# Altium footprint library DIOT_temperature_logger.PcbLib: 100 footprints (part 4 of 7)
Each footprint in its own frame and in the unit in brackets; x right, y up, seen from the top. Pads: shape width x height; smd on the part's side, far side on the other; paste and mask are expansions set on the pad; w line width, h text height; cw(c..) or ccw(c..) is an arc to the next point about the centre after c.
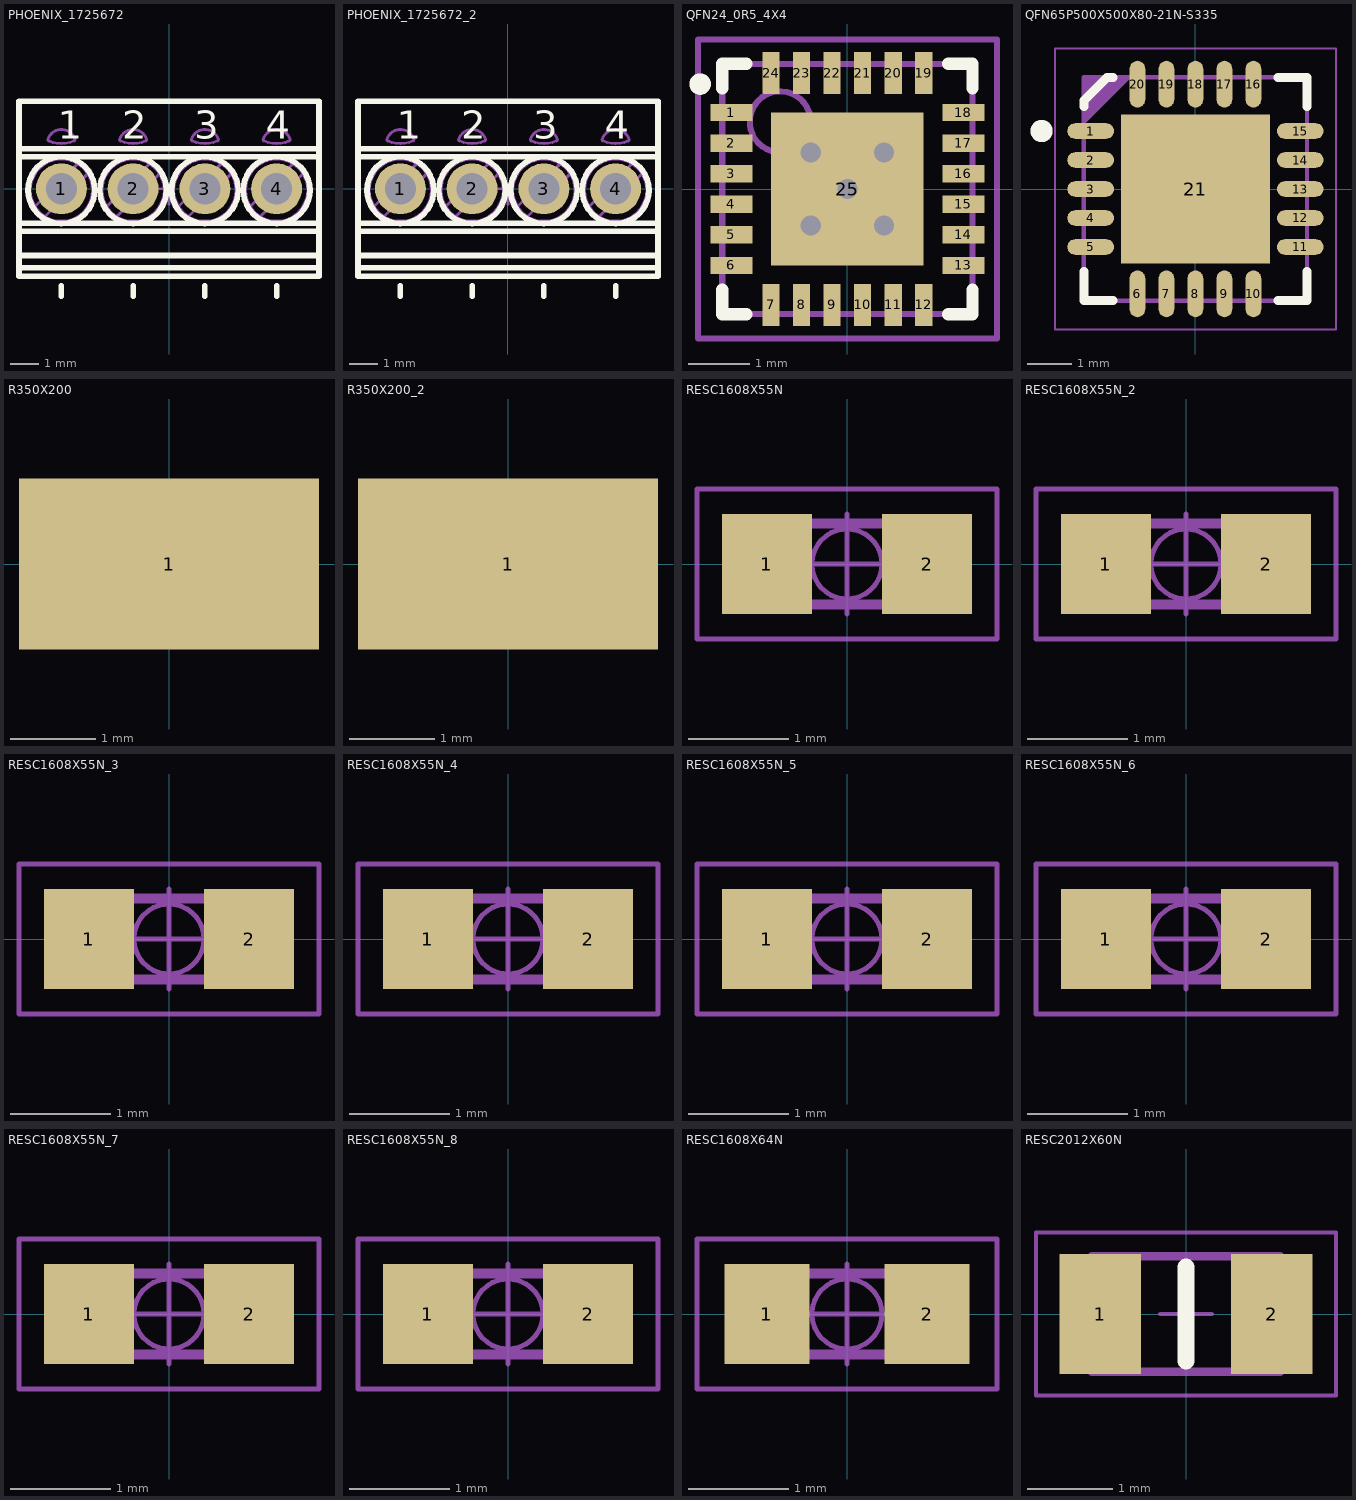
[diagram p3: the footprints below, top view; thin cyan lines are the x and y axes]

## PHOENIX_1725672 [mm]
pads (4):
  round 1.8 hole 1.1: 1(-3.81,0) 2(-1.27,0) 3(1.27,0) 4(3.81,0)
Top Overlay:
  circle w0.2: c3.81,-0.05 r1.18
  circle w0.2: c1.27,-0.05 r1.18
  circle w0.2: c-1.27,-0.05 r1.18
  circle w0.2: c-3.81,-0.05 r1.18
  lines w0.2: -5.31,-2.8 5.31,-2.8 ; -5.31,-2.361 5.31,-2.361 ; -5.31,-1.51 5.31,-1.51 ; -5.31,-1.22 5.31,-1.22 ; -5.31,1.132 5.31,1.132 ; -5.31,1.417 5.31,1.417 ; -3.81,-3.81 -3.81,-3.429 ; -1.27,-3.81 -1.27,-3.429 ; 1.27,-3.81 1.27,-3.429 ; 3.81,-3.81 3.81,-3.429 ; -5.31,-3.1 -5.31,3.1 5.31,3.1 5.31,-3.1 -5.31,-3.1
  text "4" at 3.429,1.778 h1
  text "1" at -3.937,1.778 h1
  text "2" at -1.651,1.778 h1
  text "3" at 0.889,1.778 h1
Mechanical 8:
  lines w0.1: -4.36,0 -3.81,0 -3.81,-0.55 ; -1.82,0 -1.27,0 -1.27,-0.55 ; -0.55,0 0,0 0,-0.55 ; 0.72,0 1.27,0 1.27,-0.55 ; 3.26,0 3.81,0 3.81,-0.55
Mechanical 14:
  circle w0.1: c3.81,-0.05 r1.1
  circle w0.1: c1.27,-0.05 r1.1
  circle w0.1: c-1.27,-0.05 r1.1
  circle w0.1: c-3.81,-0.05 r1.1
  lines w0.1: -5.31,-2.8 5.31,-2.8 ; -5.31,-2.361 5.31,-2.361 ; -5.31,-1.51 5.31,-1.51 ; -5.31,-1.22 5.31,-1.22 ; -5.31,1.132 5.31,1.132 ; -5.31,1.417 5.31,1.417 ; -4.744,-0.631 -3.229,0.884 ; -4.391,-0.984 -2.876,0.531 ; -2.204,-0.631 -0.689,0.884 ; -1.851,-0.984 -0.336,0.531 ; 0.336,-0.631 1.851,0.884 ; 0.689,-0.984 2.204,0.531 ; 2.876,-0.631 4.391,0.884 ; 3.229,-0.984 4.744,0.531 ; -5.31,-3.1 -5.31,3.1 5.31,3.1 5.31,-3.1 -5.31,-3.1 ; -4.285,1.757 cw(c-3.81,1.6) -3.335,1.757 cw(c-3.383,1.741) -3.362,1.696 cw(c-3.81,2.697) -4.258,1.696 cw(c-4.237,1.741) -4.285,1.757 ; -1.745,1.757 cw(c-1.27,1.6) -0.795,1.757 cw(c-0.843,1.741) -0.822,1.696 cw(c-1.27,2.697) -1.718,1.696 cw(c-1.697,1.741) -1.745,1.757 ; 0.795,1.757 cw(c1.27,1.6) 1.745,1.757 cw(c1.697,1.741) 1.718,1.696 cw(c1.27,2.697) 0.822,1.696 cw(c0.843,1.741) 0.795,1.757 ; 3.335,1.757 cw(c3.81,1.6) 4.285,1.757 cw(c4.237,1.741) 4.258,1.696 cw(c3.81,2.697) 3.362,1.696 cw(c3.383,1.741) 3.335,1.757
3D body "PHOENIX_1725672.stp": height 8.5, standoff -3.5, extent -5.31,-3.1 5.31,3.1

## PHOENIX_1725672_2 [mm]
pads (4):
  round 1.8 hole 1.1: 1(-3.81,0) 2(-1.27,0) 3(1.27,0) 4(3.81,0)
Top Overlay:
  circle w0.2: c3.81,-0.05 r1.18
  circle w0.2: c1.27,-0.05 r1.18
  circle w0.2: c-1.27,-0.05 r1.18
  circle w0.2: c-3.81,-0.05 r1.18
  lines w0.2: -5.31,-2.8 5.31,-2.8 ; -5.31,-2.361 5.31,-2.361 ; -5.31,-1.51 5.31,-1.51 ; -5.31,-1.22 5.31,-1.22 ; -5.31,1.132 5.31,1.132 ; -5.31,1.417 5.31,1.417 ; -3.81,-3.81 -3.81,-3.429 ; -1.27,-3.81 -1.27,-3.429 ; 1.27,-3.81 1.27,-3.429 ; 3.81,-3.81 3.81,-3.429 ; -5.31,-3.1 -5.31,3.1 5.31,3.1 5.31,-3.1 -5.31,-3.1
  text "4" at 3.429,1.778 h1
  text "1" at -3.937,1.778 h1
  text "2" at -1.651,1.778 h1
  text "3" at 0.889,1.778 h1
Mechanical 8:
  lines w0.1: -4.36,0 -3.81,0 -3.81,-0.55 ; -1.82,0 -1.27,0 -1.27,-0.55 ; -0.55,0 0,0 0,-0.55 ; 0.72,0 1.27,0 1.27,-0.55 ; 3.26,0 3.81,0 3.81,-0.55
Mechanical 14:
  circle w0.1: c3.81,-0.05 r1.1
  circle w0.1: c1.27,-0.05 r1.1
  circle w0.1: c-1.27,-0.05 r1.1
  circle w0.1: c-3.81,-0.05 r1.1
  lines w0.1: -5.31,-2.8 5.31,-2.8 ; -5.31,-2.361 5.31,-2.361 ; -5.31,-1.51 5.31,-1.51 ; -5.31,-1.22 5.31,-1.22 ; -5.31,1.132 5.31,1.132 ; -5.31,1.417 5.31,1.417 ; -4.744,-0.631 -3.229,0.884 ; -4.391,-0.984 -2.876,0.531 ; -2.204,-0.631 -0.689,0.884 ; -1.851,-0.984 -0.336,0.531 ; 0.336,-0.631 1.851,0.884 ; 0.689,-0.984 2.204,0.531 ; 2.876,-0.631 4.391,0.884 ; 3.229,-0.984 4.744,0.531 ; -5.31,-3.1 -5.31,3.1 5.31,3.1 5.31,-3.1 -5.31,-3.1 ; -4.285,1.757 cw(c-3.81,1.6) -3.335,1.757 cw(c-3.383,1.741) -3.362,1.696 cw(c-3.81,2.697) -4.258,1.696 cw(c-4.237,1.741) -4.285,1.757 ; -1.745,1.757 cw(c-1.27,1.6) -0.795,1.757 cw(c-0.843,1.741) -0.822,1.696 cw(c-1.27,2.697) -1.718,1.696 cw(c-1.697,1.741) -1.745,1.757 ; 0.795,1.757 cw(c1.27,1.6) 1.745,1.757 cw(c1.697,1.741) 1.718,1.696 cw(c1.27,2.697) 0.822,1.696 cw(c0.843,1.741) 0.795,1.757 ; 3.335,1.757 cw(c3.81,1.6) 4.285,1.757 cw(c4.237,1.741) 4.258,1.696 cw(c3.81,2.697) 3.362,1.696 cw(c3.383,1.741) 3.335,1.757
3D body "PHOENIX_1725672.stp": height 8.5, standoff -3.5, extent -5.31,-3.1 5.31,3.1

## QFN24_0R5_4X4 [mm]
pads (25):
  rect 0.69x0.28 smd: 1(-1.9,1.25) 2(-1.9,0.75) 3(-1.9,0.25) 4(-1.9,-0.25) 5(-1.9,-0.75) 6(-1.9,-1.25) 13(1.9,-1.25) 14(1.9,-0.75) 15(1.9,-0.25) 16(1.9,0.25) 17(1.9,0.75) 18(1.9,1.25)
  rect 0.28x0.69 smd: 7(-1.25,-1.9) 8(-0.75,-1.9) 9(-0.25,-1.9) 10(0.25,-1.9) 11(0.75,-1.9) 12(1.25,-1.9) 19(1.25,1.9) 20(0.75,1.9) 21(0.25,1.9) 22(-0.25,1.9) 23(-0.75,1.9) 24(-1.25,1.9)
  rect 2.5x2.5 smd: 25(0,0)
via 0,0 diameter 0.66 hole 0.33
via 0.6,-0.6 diameter 0.66 hole 0.33
via -0.6,-0.6 diameter 0.66 hole 0.33
via 0.6,0.6 diameter 0.66 hole 0.33
via -0.6,0.6 diameter 0.66 hole 0.33
Top Overlay:
  circle w0.25: c-2.413,1.719 r0.051
  lines w0.2: -2.05,-1.651 -2.05,-2.05 -1.651,-2.05 ; -2.05,1.651 -2.05,2.05 -1.651,2.05 ; 1.651,-2.05 2.05,-2.05 2.05,-1.651 ; 1.651,2.05 2.05,2.05 2.05,1.651
Mechanical 13:
  circle w0.1: c-1.1,1.1 r0.5
  lines w0.1: -2.05,-2.05 2.05,-2.05 2.05,2.05 -2.05,2.05 -2.05,-2.05
Mechanical 15:
  lines w0.1: -0.5,0 0.5,0 ; 0,-0.5 0,0.5 ; -2.45,-2.45 2.45,-2.45 2.45,2.45 -2.45,2.45 -2.45,-2.45
3D body: height 1, standoff 0.02, extent -2.05,-2.05 2.05,2.05

## QFN65P500X500X80-21N-S335 [mm]
pads (21):
  oval 1.05x0.35 smd: 1(-2.35,1.3) 2(-2.35,0.65) 3(-2.35,0) 4(-2.35,-0.65) 5(-2.35,-1.3) 11(2.35,-1.3) 12(2.35,-0.65) 13(2.35,0) 14(2.35,0.65) 15(2.35,1.3)
  oval 0.35x1.05 smd: 6(-1.3,-2.35) 7(-0.65,-2.35) 8(0,-2.35) 9(0.65,-2.35) 10(1.3,-2.35) 16(1.3,2.35) 17(0.65,2.35) 18(0,2.35) 19(-0.65,2.35) 20(-1.3,2.35)
  rect 3.35x3.35 smd: 21(0,0)
Top Overlay:
  circle w0.25: c-3.45,1.3 r0.125
  lines w0.2: -2.5,-1.85 -2.5,-2.5 -1.85,-2.5 ; -2.5,1.85 -2.5,1.98 -1.98,2.5 -1.85,2.5 ; 1.85,-2.5 2.5,-2.5 2.5,-1.85 ; 1.85,2.5 2.5,2.5 2.5,1.85
Mechanical 14:
  lines w0.1: -2.5,1.5 -1.5,2.5 ; -2.5,1.6 -1.6,2.5 ; -2.5,1.7 -1.7,2.5 ; -2.5,1.8 -1.8,2.5 ; -2.5,1.9 -1.9,2.5 ; -2.5,2 -2,2.5 ; -2.5,2.1 -2.1,2.5 ; -2.5,2.2 -2.2,2.5 ; -2.5,2.3 -2.3,2.5 ; -2.5,2.4 -2.4,2.5 ; -2.5,-2.5 -2.5,2.5 2.5,2.5 2.5,-2.5 -2.5,-2.5
Mechanical 15:
  lines w0.05: -0.5,0 0.5,0 ; 0,-0.5 0,0.5 ; -3.15,-3.15 -3.15,3.15 3.15,3.15 3.15,-3.15 -3.15,-3.15
3D body "QFN65P500X500X100-21N-S325.stp": height 1, standoff 0, extent -2.575,-2.575 2.575,2.575

## R350X200 [mm]
pads (1):
  rect 3.5x2 smd paste-1: 1(0,0)

## R350X200_2 [mm]
pads (1):
  rect 3.5x2 smd paste-1: 1(0,0)

## RESC1608X55N [mm]
pads (2):
  rect 0.9x1 smd: 1(-0.8,0) 2(0.8,0)
Mechanical 14:
  lines w0.1: -0.8,-0.405 -0.8,0.405 0.8,0.405 0.8,-0.405 -0.8,-0.405
Mechanical 15:
  circle w0.05: c0,0 r0.35
  lines w0.05: -0.5,0 0.5,0 ; 0,-0.5 0,0.5 ; -1.5,-0.75 1.5,-0.75 1.5,0.75 -1.5,0.75 -1.5,-0.75
3D body "RESC1608X55N.stp": height 0.55, standoff 0, extent -0.875,-0.475 0.875,0.475

## RESC1608X55N_2 [mm]
pads (2):
  rect 0.9x1 smd: 1(-0.8,0) 2(0.8,0)
Mechanical 14:
  lines w0.1: -0.8,-0.405 0.8,-0.405 0.8,0.405 -0.8,0.405 -0.8,-0.405
Mechanical 15:
  circle w0.05: c0,0 r0.35
  lines w0.05: -0.5,0 0.5,0 ; 0,-0.5 0,0.5 ; -1.5,-0.75 -1.5,0.75 1.5,0.75 1.5,-0.75 -1.5,-0.75
3D body "RESC1608X55N.stp": height 0.55, standoff 0, extent -0.875,-0.475 0.875,0.475

## RESC1608X55N_3 [mm]
pads (2):
  rect 0.9x1 smd: 1(-0.8,0) 2(0.8,0)
Mechanical 14:
  lines w0.1: -0.8,-0.405 -0.8,0.405 0.8,0.405 0.8,-0.405 -0.8,-0.405
Mechanical 15:
  circle w0.05: c0,0 r0.35
  lines w0.05: -0.5,0 0.5,0 ; 0,-0.5 0,0.5 ; -1.5,-0.75 1.5,-0.75 1.5,0.75 -1.5,0.75 -1.5,-0.75
3D body "RESC1608X55N.stp": height 0.55, standoff 0, extent -0.875,-0.475 0.875,0.475

## RESC1608X55N_4 [mm]
pads (2):
  rect 0.9x1 smd: 1(-0.8,0) 2(0.8,0)
Mechanical 14:
  lines w0.1: -0.8,-0.405 -0.8,0.405 0.8,0.405 0.8,-0.405 -0.8,-0.405
Mechanical 15:
  circle w0.05: c0,0 r0.35
  lines w0.05: -0.5,0 0.5,0 ; 0,-0.5 0,0.5 ; -1.5,-0.75 1.5,-0.75 1.5,0.75 -1.5,0.75 -1.5,-0.75
3D body "RESC1608X55N.stp": height 0.55, standoff 0, extent -0.875,-0.475 0.875,0.475

## RESC1608X55N_5 [mm]
pads (2):
  rect 0.9x1 smd: 1(-0.8,0) 2(0.8,0)
Mechanical 14:
  lines w0.1: -0.8,-0.405 0.8,-0.405 0.8,0.405 -0.8,0.405 -0.8,-0.405
Mechanical 15:
  circle w0.05: c0,0 r0.35
  lines w0.05: -0.5,0 0.5,0 ; 0,-0.5 0,0.5 ; -1.5,-0.75 -1.5,0.75 1.5,0.75 1.5,-0.75 -1.5,-0.75
3D body "RESC1608X55N.stp": height 0.55, standoff 0, extent -0.875,-0.475 0.875,0.475

## RESC1608X55N_6 [mm]
pads (2):
  rect 0.9x1 smd: 1(-0.8,0) 2(0.8,0)
Mechanical 14:
  lines w0.1: -0.8,-0.405 0.8,-0.405 0.8,0.405 -0.8,0.405 -0.8,-0.405
Mechanical 15:
  circle w0.05: c0,0 r0.35
  lines w0.05: -0.5,0 0.5,0 ; 0,-0.5 0,0.5 ; -1.5,-0.75 -1.5,0.75 1.5,0.75 1.5,-0.75 -1.5,-0.75
3D body "RESC1608X55N.stp": height 0.55, standoff 0, extent -0.875,-0.475 0.875,0.475

## RESC1608X55N_7 [mm]
pads (2):
  rect 0.9x1 smd: 1(-0.8,0) 2(0.8,0)
Mechanical 14:
  lines w0.1: -0.8,-0.405 -0.8,0.405 0.8,0.405 0.8,-0.405 -0.8,-0.405
Mechanical 15:
  circle w0.05: c0,0 r0.35
  lines w0.05: -0.5,0 0.5,0 ; 0,-0.5 0,0.5 ; -1.5,-0.75 1.5,-0.75 1.5,0.75 -1.5,0.75 -1.5,-0.75
3D body "RESC1608X55N.stp": height 0.55, standoff 0, extent -0.875,-0.475 0.875,0.475

## RESC1608X55N_8 [mm]
pads (2):
  rect 0.9x1 smd: 1(-0.8,0) 2(0.8,0)
Mechanical 14:
  lines w0.1: -0.8,-0.405 -0.8,0.405 0.8,0.405 0.8,-0.405 -0.8,-0.405
Mechanical 15:
  circle w0.05: c0,0 r0.35
  lines w0.05: -0.5,0 0.5,0 ; 0,-0.5 0,0.5 ; -1.5,-0.75 1.5,-0.75 1.5,0.75 -1.5,0.75 -1.5,-0.75
3D body "RESC1608X55N.stp": height 0.55, standoff 0, extent -0.875,-0.475 0.875,0.475

## RESC1608X64N [mm]
pads (2):
  rect 0.85x1 smd: 1(-0.8,0) 2(0.8,0)
Mechanical 14:
  lines w0.1: -0.8,-0.405 -0.8,0.405 0.8,0.405 0.8,-0.405 -0.8,-0.405
Mechanical 15:
  circle w0.05: c0,0 r0.35
  lines w0.05: -0.5,0 0.5,0 ; 0,-0.5 0,0.5 ; -1.5,-0.75 -1.5,0.75 1.5,0.75 1.5,-0.75 -1.5,-0.75
3D body "RESC1608X64N.stp": height 0.64, standoff 0, extent -0.875,-0.475 0.875,0.475

## RESC2012X60N [mm]
pads (2):
  rect 0.95x1.4 smd: 1(-1,0) 2(1,0)
Top Overlay:
  lines w0.2: 0,-0.55 0,0.55
Mechanical 14:
  lines w0.1: -1.1,0.675 -1.1,-0.675 1.1,-0.675 1.1,0.675 ; -1.1,0.675 1.1,0.675
Mechanical 15:
  lines w0.05: -0.3,0 0.3,0 ; 0,-0.3 0,0.3 ; -1.75,-0.95 -1.75,0.95 1.75,0.95 1.75,-0.95 -1.75,-0.95
3D body "RESC2012X60N.stp": height 0.6, standoff 0, extent -1.1,-0.675 1.1,0.675